# Altium footprint library AltiumLibraryDDT.PcbLib: 106 footprints (part 2 of 7)
Each footprint in its own frame and in the unit in brackets; x right, y up, seen from the top. Pads: shape width x height; smd on the part's side, far side on the other; paste and mask are expansions set on the pad; w line width, h text height; cw(c..) or ccw(c..) is an arc to the next point about the centre after c.
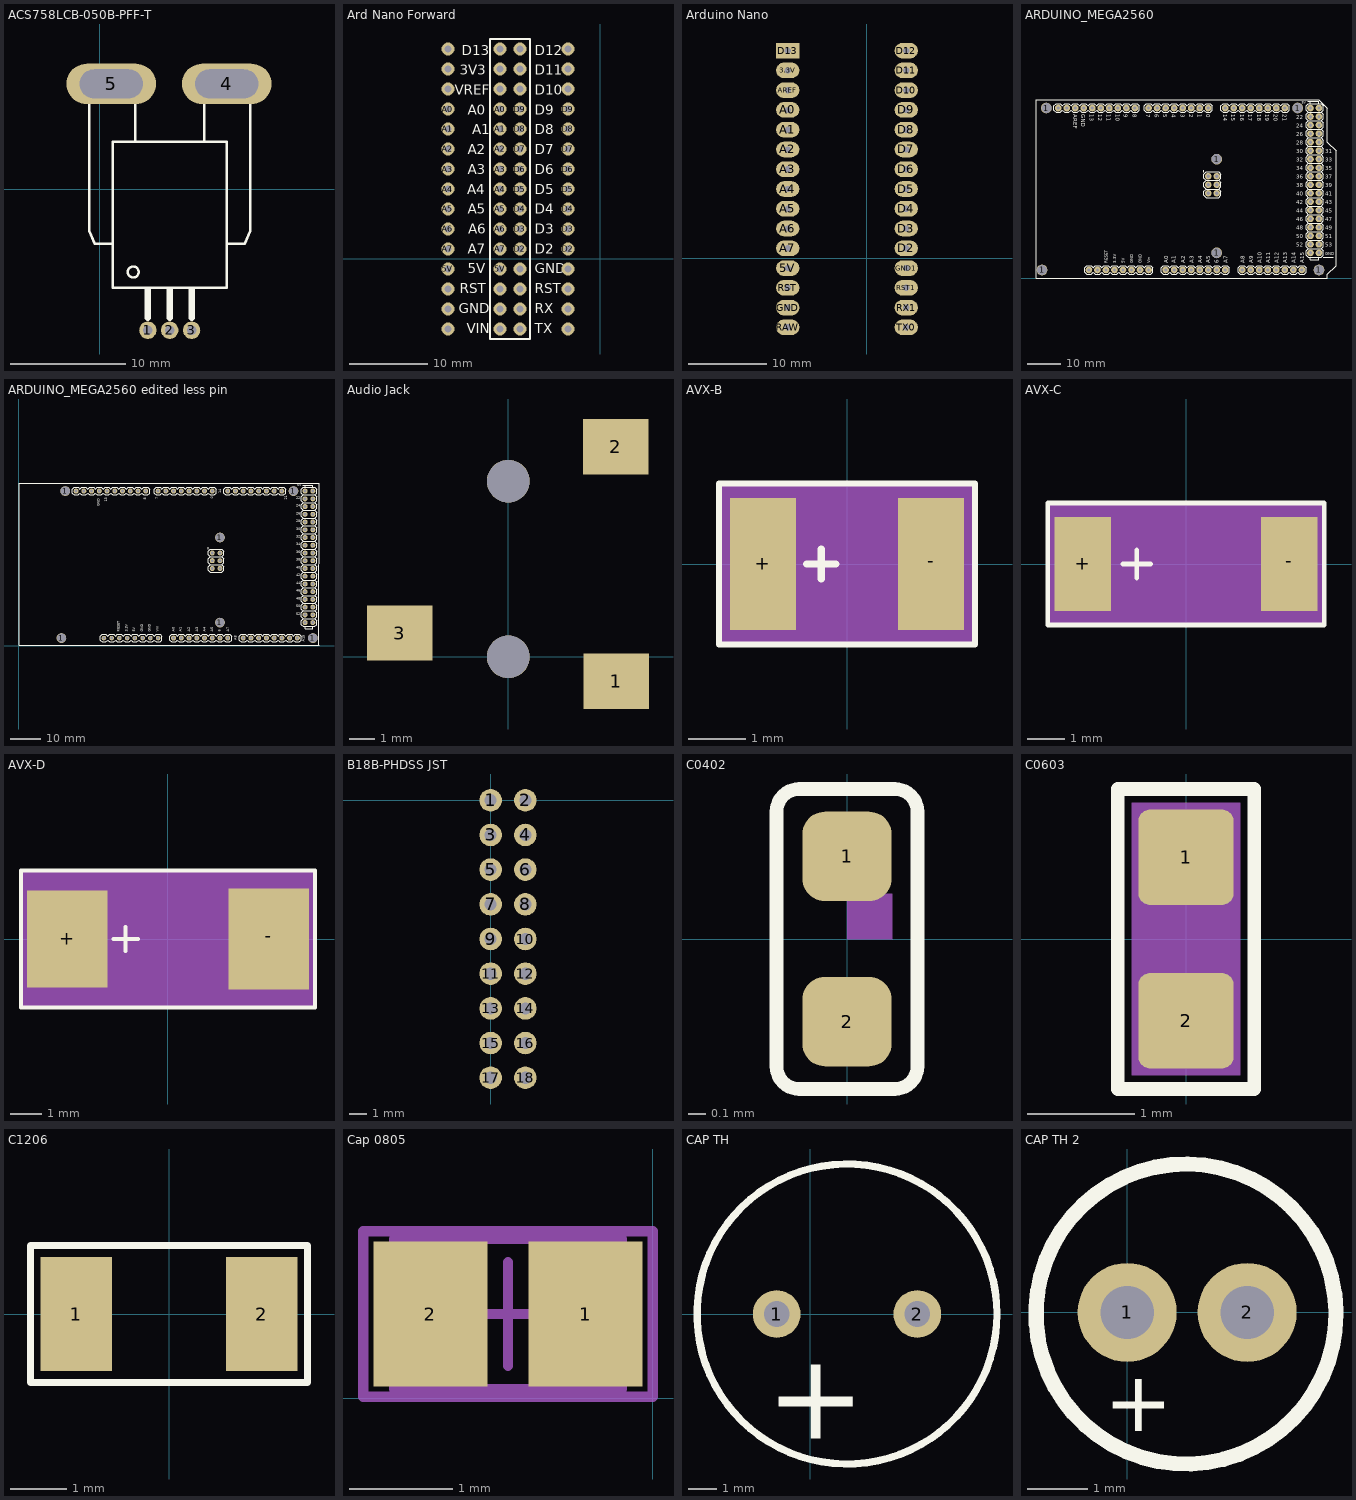
[diagram p1: the footprints below, top view; thin cyan lines are the x and y axes]

## ACS758LCB-050B-PFF-T [mil]
pads (5):
  oval 59.06x60 hole 31.5: 1(165,-483) 2(240,-483) 3(315,-483)
  oval 307.09x137.8 hole 98.43 slot 216.54 at 0 deg: 4(435,360) 5(40,360)
Top Overlay:
  circle w8: c115,-283.78 r18.8
  lines w8: -35.59,382.56 -35.59,162.09 -35.59,-143.03 -16.89,-187.32 42.17,-187.32 ; 121.89,162.09 121.89,382.56 ; 358.11,162.09 358.11,382.56 ; 436.85,-187.32 496.89,-187.32 515.59,-143.03 515.59,162.09 515.59,382.56 ; 45.12,-337.91 434.88,-337.91 434.88,162.09 45.12,162.09 45.12,-337.91
  lines w23.62: 164.8,-440.28 164.8,-346.77 ; 240,-440.28 240,-346.77 ; 315.2,-440.28 315.2,-346.77
3D body: height 275.59, standoff 0, extent 40,-347.5 440,167.5

## Ard Nano Forward [mil] "Arduino Nano, ATMEGA328"
pads (60):
  round 65 hole 35: 3.3V(-760,950) 3.3V(-500,950) 5V(-760,-50) 5V(-500,-50) A0(-760,750) A0(-500,750) A1(-760,650) A1(-500,650) A2(-760,550) A2(-500,550) A3(-760,450) A3(-500,450) A4(-760,350) A4(-500,350) A5(-760,250) A5(-500,250) A6(-760,150) A6(-500,150) A7(-760,50) A7(-500,50) AREF(-760,850) AREF(-500,850) D2(-400,50) D2(-160,50) D3(-400,150) D3(-160,150) D4(-400,250) D4(-160,250) D5(-400,350) D5(-160,350) D6(-400,450) D6(-160,450) D7(-400,550) D7(-160,550) D8(-400,650) D8(-160,650) D9(-400,750) D9(-160,750) D10(-400,850) D10(-160,850) D11(-400,950) D11(-160,950) D12(-400,1050) D12(-160,1050) D13(-760,1050) D13(-500,1050) GND(-760,-250) GND(-500,-250) GND1(-400,-50) GND1(-160,-50) RAW(-760,-350) RAW(-500,-350) RST(-760,-150) RST(-500,-150) RST1(-400,-150) RST1(-160,-150) RX1(-400,-250) RX1(-160,-250) TX0(-400,-350) TX0(-160,-350)
Top Overlay:
  lines w10: -550,-400 -350,-400 -350,1100 -550,1100 -550,-400
  text "A7" at -660.72,27.14 h50
  text "A6" at -658.34,126.43 h50
  text "A5" at -660.72,225.71 h50
  text "A4" at -663.1,325 h50
  text "A3" at -660.72,424.29 h50
  text "A2" at -660.72,523.57 h50
  text "A1" at -639.3,622.86 h50
  text "A0" at -660.72,722.14 h50
  text "VREF" at -726.9,821.43 h50
  text "3V3" at -700,920.71 h50
  text "D13" at -692.14,1020 h50
  text "5V" at -660.25,-72.14 h50
  text "RST" at -700,-171.43 h50
  text "GND" at -705.24,-270.71 h50
  text "VIN" at -665.96,-370 h50
  text "TX" at -326.9,-370 h50
  text "RX" at -326.9,-270.71 h50
  text "RST" at -326.9,-171.43 h50
  text "GND" at -326.9,-72.14 h50
  text "D12" at -326.9,1020 h50
  text "D11" at -326.9,920.71 h50
  text "D10" at -326.9,821.43 h50
  text "D9" at -326.9,722.14 h50
  text "D8" at -326.9,622.86 h50
  text "D7" at -326.9,523.57 h50
  text "D6" at -326.9,424.29 h50
  text "D5" at -326.9,325 h50
  text "D4" at -326.9,225.71 h50
  text "D3" at -326.9,126.43 h50
  text "D2" at -326.9,27.14 h50
Bottom Overlay:
  lines w10: -550,-400 -550,1100 -350,1100 -350,-400 -550,-400
  text "VIN" at -586.9,-370 h50
  text "GND" at -586.9,-270.71 h50
  text "RST" at -586.9,-171.43 h50
  text "5V" at -586.9,-72.14 h50
  text "D13" at -586.9,1020 h50
  text "3V3" at -586.9,920.71 h50
  text "VREF" at -586.9,821.43 h50
  text "A0" at -586.9,722.14 h50
  text "A1" at -586.9,622.86 h50
  text "A2" at -586.9,523.57 h50
  text "A3" at -586.9,424.29 h50
  text "A4" at -586.9,325 h50
  text "A5" at -586.9,225.71 h50
  text "A6" at -586.9,126.43 h50
  text "A7" at -586.9,27.14 h50
  text "D2" at -216.9,27.14 h50
  text "D3" at -216.9,126.43 h50
  text "D4" at -216.9,225.71 h50
  text "D5" at -216.9,325 h50
  text "D6" at -216.9,424.29 h50
  text "D7" at -216.9,523.57 h50
  text "D8" at -216.9,622.86 h50
  text "D9" at -216.9,722.14 h50
  text "D10" at -216.9,821.43 h50
  text "D11" at -216.9,920.71 h50
  text "D12" at -216.9,1020 h50
  text "GND" at -216.9,-72.14 h50
  text "RST" at -216.9,-171.43 h50
  text "RX" at -216.9,-270.71 h50
  text "TX" at -216.9,-370 h50
3D body "SAINSMART NANO V3.0 ATMEGA328.STEP": height 483.86, standoff -222.83, extent -811,-507.59 -111,1268

## Arduino Nano [mm] "Arduino Nano, ATMEGA328"
pads (30):
  oval 3x2 hole 0.8: 3.3V(-10.16,24.13) 5V(-10.16,-1.27) A0(-10.16,19.05) A1(-10.16,16.51) A2(-10.16,13.97) A3(-10.16,11.43) A4(-10.16,8.89) A5(-10.16,6.35) A6(-10.16,3.81) A7(-10.16,1.27) AREF(-10.16,21.59) D2(5.08,1.27) D3(5.08,3.81) D4(5.08,6.35) D5(5.08,8.89) D6(5.08,11.43) D7(5.08,13.97) D8(5.08,16.51) D9(5.08,19.05) D10(5.08,21.59) D11(5.08,24.13) D12(5.08,26.67) GND(-10.16,-6.35) GND1(5.08,-1.27) RAW(-10.16,-8.89) RST(-10.16,-3.81) RST1(5.08,-3.81) RX1(5.08,-6.35) TX0(5.08,-8.89)
  rect 3x2 hole 0.8: D13(-10.16,26.67)
3D body "arduino nano.stp": height 12.64, standoff 0.69, extent -11.286,-12.996 6.714,32.004

## ARDUINO_MEGA2560 [mm]
pads (98):
  round 2 hole 1: 0(63.5,50.8) 1(60.96,50.8) 2(58.42,50.8) 3(55.88,50.8) 3.3V(35.56,2.54) 4(53.34,50.8) 5(50.8,50.8) 5V(38.1,2.54) 5V.(93.98,50.8) 5V..(96.52,50.8) 6(48.26,50.8) 7(45.72,50.8) 8(41.656,50.8) 9(39.116,50.8) 10(36.576,50.8) 11(34.036,50.8) 12(31.496,50.8) 13(28.956,50.8) 14(68.58,50.8) 15(71.12,50.8) 16(73.66,50.8) 17(76.2,50.8) 18(78.74,50.8) 19(81.28,50.8) 20(83.82,50.8) 21(86.36,50.8) 22(93.98,48.26) 23(96.52,48.26) 24(93.98,45.72) 25(96.52,45.72) 26(93.98,43.18) 27(96.52,43.18) 28(93.98,40.64) 29(96.52,40.64) 30(93.98,38.1) 31(96.52,38.1) 32(93.98,35.56) 33(96.52,35.56) 34(93.98,33.02) 35(96.52,33.02) 36(93.98,30.48) 37(96.52,30.48) 38(93.98,27.94) 39(96.52,27.94) 40(93.98,25.4) 41(96.52,25.4) 42(93.98,22.86) 43(96.52,22.86) 44(93.98,20.32) 45(96.52,20.32) 46(93.98,17.78) 47(96.52,17.78) 48(93.98,15.24) 49(96.52,15.24) 50(93.98,12.7) 51(96.52,12.7) 52(93.98,10.16) 53(96.52,10.16) +5V_(66.04,30.48) A0(50.8,2.54) A1(53.34,2.54) A2(55.88,2.54) A3(58.42,2.54) A4(60.96,2.54) A5(63.5,2.54) A6(66.04,2.54) A7(68.58,2.54) A8(73.66,2.54) A9(76.2,2.54) A10(78.74,2.54) A11(81.28,2.54) A12(83.82,2.54) A13(86.36,2.54) A14(88.9,2.54) A15(91.44,2.54) AREF(23.876,50.8) GND(26.416,50.8) GND.(43.18,2.54) GND..(40.64,2.54) GND...(93.98,7.62) GND....(96.52,7.62) GND__(66.04,25.4) I/OREF(30.48,2.54) MISO(63.5,30.48) MOSI(66.04,27.94) N/C(27.94,2.54) RESET(33.02,2.54) RESET.(63.5,25.4) SCK(63.5,27.94) SCL1(18.796,50.8) SDA1(21.336,50.8) VIN(45.72,2.54)
  round 3.2 hole 3: 1(13.97,2.54) 1(15.24,50.8) 1(66.04,7.62) 1(66.04,35.56) 1(90.17,50.8) 1(96.52,2.54)
Top Overlay:
  drawing of 479 lines, arcs and shapes, not listed
  text "5V" at 91.44,52.07 h0.76
  text "AREF" at 23.241,49.022 h1.21
  text "GND" at 25.654,49.022 h1.21
  text "Vin" at 46.228,4.597 h0.86
  text "GND" at 43.688,4.597 h0.86
  text "GND" at 41.148,4.597 h0.86
  text "5V" at 38.608,4.597 h0.86
  text "3.3V" at 36.068,4.597 h0.86
  text "RESET" at 33.528,4.597 h0.86
  text "GND" at 98.425,6.883 h0.86
  text "A15" at 92.075,4.597 h1.21
  text "A14" at 89.662,4.597 h1.21
  text "A13" at 87.122,4.597 h1.21
  text "A12" at 84.582,4.597 h1.21
  text "A11" at 82.042,4.597 h1.21
  text "A10" at 79.502,4.597 h1.21
  text "A9" at 76.962,4.597 h1.21
  text "A8" at 74.422,4.597 h1.21
  text "A7" at 69.342,4.597 h1.21
  text "6" at 66.675,4.597 h1.21
  text "A5" at 64.135,4.597 h1.21
  text "A4" at 61.722,4.597 h1.21
  text "A3" at 59.182,4.597 h1.21
  text "A2" at 56.642,4.597 h1.21
  text "A1" at 53.848,4.597 h1.21
  text "A0" at 51.562,4.597 h1.21
  text "53" at 98.425,9.423 h1.21
  text "51" at 98.425,11.963 h1.21
  text "49" at 98.425,14.503 h1.21
  text "47" at 98.425,17.043 h1.21
  text "45" at 98.425,19.583 h1.21
  text "43" at 98.425,22.123 h1.21
  text "41" at 98.425,24.663 h1.21
  text "39" at 98.425,27.203 h1.21
  text "37" at 98.425,29.743 h1.21
  text "35" at 98.425,32.283 h1.21
  text "33" at 98.425,34.823 h1.21
  text "31" at 98.425,37.363 h1.21
  text "52" at 89.687,9.398 h1.21
  text "48" at 89.687,14.478 h1.21
  text "50" at 89.687,11.938 h1.21
  text "46" at 89.687,17.018 h1.21
  text "44" at 89.687,19.558 h1.21
  text "42" at 89.687,22.098 h1.21
  text "40" at 89.687,24.638 h1.21
  text "38" at 89.687,27.178 h1.21
  text "36" at 89.687,29.718 h1.21
  text "34" at 89.687,32.258 h1.21
  text "32" at 89.687,34.798 h1.21
  text "30" at 89.687,37.338 h1.21
  text "28" at 89.687,39.878 h1.21
  text "26" at 89.687,42.418 h1.21
  text "24" at 89.687,44.958 h1.21
  text "22" at 89.687,47.498 h1.21
  text "21" at 85.725,48.895 h1.21
  text "20" at 83.058,48.895 h1.21
  text "19" at 80.518,49.022 h1.21
  text "18" at 78.105,49.022 h1.21
  text "17" at 75.438,49.022 h1.21
  text "16" at 73.025,49.022 h1.21
  text "15" at 70.358,49.022 h1.21
  text "14" at 67.945,49.022 h1.21
  text "13" at 28.194,49.022 h1.21
  text "12" at 30.734,49.022 h1.21
  text "11" at 33.274,49.022 h1.21
  text "10" at 35.941,49.022 h1.21
  text "9" at 38.354,49.022 h1.21
  text "8" at 41.021,49.022 h1.21
  text "7" at 45.085,49.022 h1.21
  text "6" at 47.625,49.022 h1.21
  text "5" at 50.165,49.022 h1.21
  text "4" at 52.705,49.022 h1.21
  text "3" at 55.245,49.022 h1.21
  text "2" at 57.785,49.022 h1.21
  text "1" at 60.325,49.022 h1.21
  text "0" at 62.865,49.022 h1.21
Mechanical 16:
  region: 66.294,30.226 66.294,30.734 65.786,30.734 65.786,30.226
  region: 63.754,30.226 63.754,30.734 63.246,30.734 63.246,30.226
  region: 66.294,27.686 66.294,28.194 65.786,28.194 65.786,27.686
  region: 63.754,27.686 63.754,28.194 63.246,28.194 63.246,27.686
  region: 63.754,25.146 63.754,25.654 63.246,25.654 63.246,25.146
  region: 66.294,25.146 66.294,25.654 65.786,25.654 65.786,25.146
  rectangle: 27.686,2.286 28.194,2.794
  rectangle: 30.226,2.286 30.734,2.794
  rectangle: 18.542,50.546 19.05,51.054
  rectangle: 21.082,50.546 21.59,51.054
  rectangle: 32.766,2.286 33.274,2.794
  rectangle: 35.306,2.286 35.814,2.794
  rectangle: 37.846,2.286 38.354,2.794
  rectangle: 40.386,2.286 40.894,2.794
  rectangle: 42.926,2.286 43.434,2.794
  rectangle: 45.466,2.286 45.974,2.794
  rectangle: 93.726,50.546 94.234,51.054
  rectangle: 96.266,50.546 96.774,51.054
  rectangle: 93.726,7.366 94.234,7.874
  rectangle: 96.266,7.366 96.774,7.874
  region: 96.774,27.686 96.774,28.194 96.266,28.194 96.266,27.686
  region: 94.234,27.686 94.234,28.194 93.726,28.194 93.726,27.686
  region: 96.774,25.146 96.774,25.654 96.266,25.654 96.266,25.146
  region: 94.234,25.146 94.234,25.654 93.726,25.654 93.726,25.146
  region: 96.774,22.606 96.774,23.114 96.266,23.114 96.266,22.606
  region: 96.774,20.066 96.774,20.574 96.266,20.574 96.266,20.066
  region: 96.774,17.526 96.774,18.034 96.266,18.034 96.266,17.526
  region: 94.234,22.606 94.234,23.114 93.726,23.114 93.726,22.606
  region: 94.234,20.066 94.234,20.574 93.726,20.574 93.726,20.066
  region: 94.234,17.526 94.234,18.034 93.726,18.034 93.726,17.526
  region: 96.774,14.986 96.774,15.494 96.266,15.494 96.266,14.986
  region: 94.234,14.986 94.234,15.494 93.726,15.494 93.726,14.986
  region: 96.774,12.446 96.774,12.954 96.266,12.954 96.266,12.446
  region: 94.234,12.446 94.234,12.954 93.726,12.954 93.726,12.446
  region: 94.234,9.906 94.234,10.414 93.726,10.414 93.726,9.906
  region: 96.774,9.906 96.774,10.414 96.266,10.414 96.266,9.906
  region: 96.774,48.006 96.774,48.514 96.266,48.514 96.266,48.006
  region: 94.234,48.006 94.234,48.514 93.726,48.514 93.726,48.006
  region: 96.774,45.466 96.774,45.974 96.266,45.974 96.266,45.466
  region: 94.234,45.466 94.234,45.974 93.726,45.974 93.726,45.466
  region: 96.774,42.926 96.774,43.434 96.266,43.434 96.266,42.926
  region: 96.774,40.386 96.774,40.894 96.266,40.894 96.266,40.386
  region: 96.774,37.846 96.774,38.354 96.266,38.354 96.266,37.846
  region: 94.234,42.926 94.234,43.434 93.726,43.434 93.726,42.926
  region: 94.234,40.386 94.234,40.894 93.726,40.894 93.726,40.386
  region: 94.234,37.846 94.234,38.354 93.726,38.354 93.726,37.846
  region: 96.774,35.306 96.774,35.814 96.266,35.814 96.266,35.306
  region: 94.234,35.306 94.234,35.814 93.726,35.814 93.726,35.306
  region: 96.774,32.766 96.774,33.274 96.266,33.274 96.266,32.766
  region: 94.234,32.766 94.234,33.274 93.726,33.274 93.726,32.766
  region: 94.234,30.226 94.234,30.734 93.726,30.734 93.726,30.226
  region: 96.774,30.226 96.774,30.734 96.266,30.734 96.266,30.226
  rectangle: 41.402,50.546 41.91,51.054
  rectangle: 23.622,50.546 24.13,51.054
  rectangle: 26.162,50.546 26.67,51.054
  rectangle: 28.702,50.546 29.21,51.054
  rectangle: 31.242,50.546 31.75,51.054
  rectangle: 33.782,50.546 34.29,51.054
  rectangle: 36.322,50.546 36.83,51.054
  rectangle: 38.862,50.546 39.37,51.054
  rectangle: 63.246,50.546 63.754,51.054
  rectangle: 45.466,50.546 45.974,51.054
  rectangle: 48.006,50.546 48.514,51.054
  rectangle: 50.546,50.546 51.054,51.054
  rectangle: 53.086,50.546 53.594,51.054
  rectangle: 55.626,50.546 56.134,51.054
  rectangle: 58.166,50.546 58.674,51.054
  rectangle: 60.706,50.546 61.214,51.054
  rectangle: 68.326,2.286 68.834,2.794
  rectangle: 50.546,2.286 51.054,2.794
  rectangle: 53.086,2.286 53.594,2.794
  rectangle: 55.626,2.286 56.134,2.794
  rectangle: 58.166,2.286 58.674,2.794
  rectangle: 60.706,2.286 61.214,2.794
  rectangle: 63.246,2.286 63.754,2.794
  rectangle: 65.786,2.286 66.294,2.794
  rectangle: 86.106,50.546 86.614,51.054
  rectangle: 68.326,50.546 68.834,51.054
  rectangle: 70.866,50.546 71.374,51.054
  rectangle: 73.406,50.546 73.914,51.054
  rectangle: 75.946,50.546 76.454,51.054
  rectangle: 78.486,50.546 78.994,51.054
  rectangle: 81.026,50.546 81.534,51.054
  rectangle: 83.566,50.546 84.074,51.054
  rectangle: 91.186,2.286 91.694,2.794
  rectangle: 73.406,2.286 73.914,2.794
  rectangle: 75.946,2.286 76.454,2.794
  rectangle: 78.486,2.286 78.994,2.794
  rectangle: 81.026,2.286 81.534,2.794
  rectangle: 83.566,2.286 84.074,2.794
  rectangle: 86.106,2.286 86.614,2.794
  rectangle: 88.646,2.286 89.154,2.794
3D body "arduino MEGA2650.STEP": height -0.38, standoff -15.63, extent -6.502,0.051 101.448,53.391
3D body "Pin Header 1x8 TH Pitch 2.54mm.stp": height 2.44, standoff -10.26, extent 26.67,1.27 46.99,3.81
3D body "Pin Header 1x10 TH Pitch 2.54mm.stp": height 2.44, standoff -10.26, extent 92.71,26.67 95.25,52.07
3D body "Pin Header 1x10 TH Pitch 2.54mm.stp": height 2.44, standoff -10.26, extent 95.25,26.67 97.79,52.07
3D body "Pin Header 1x10 TH Pitch 2.54mm.stp": height 2.44, standoff -10.26, extent 17.526,49.53 42.926,52.07

## ARDUINO_MEGA2560 edited less pin [mil]
pads (98):
  round 65 hole 35: 0(2500,2000) 1(2400,2000) 2(2300,2000) 3(2200,2000) 4(2100,2000) 5(2000,2000) 5V.(3700,2000) 5V..(3800,2000) 6(1900,2000) 7(1800,2000) 8(1640,2000) 9(1540,2000) 10(1440,2000) 11(1340,2000) 12(1240,2000) 13(1140,2000) 14(2700,2000) 15(2800,2000) 16(2900,2000) 17(3000,2000) 18(3100,2000) 19(3200,2000) 20(3300,2000) 21(3400,2000) 22(3700,1900) 23(3800,1900) 24(3700,1800) 25(3800,1800) 26(3700,1700) 27(3800,1700) 28(3700,1600) 29(3800,1600) 30(3700,1500) 31(3800,1500) 32(3700,1400) 33(3800,1400) 34(3700,1300) 35(3800,1300) 36(3700,1200) 37(3800,1200) 38(3700,1100) 39(3800,1100) 40(3700,1000) 41(3800,1000) 42(3700,900) 43(3800,900) 44(3700,800) 45(3800,800) 46(3700,700) 47(3800,700) 48(3700,600) 49(3800,600) 50(3700,500) 51(3800,500) 52(3700,400) 53(3800,400) +5V_(2600,1200) A0(2000,100) A1(2100,100) A2(2200,100) A3(2300,100) A4(2400,100) A5(2500,100) A6(2600,100) A7(2700,100) A8(2900,100) A9(3000,100) A10(3100,100) A11(3200,100) A12(3300,100) A13(3400,100) A14(3500,100) A15(3600,100) AREF(940,2000) GND(1040,2000) GND...(3700,300) GND....(3800,300) GND__(2600,1000) MISO(2500,1200) MOSI(2600,1100) RESET.(2500,1000) SCK(2500,1100) SCL1(740,2000) SDA1(840,2000)
  round 125.98 hole 118.11: 1(550,100) 1(600,2000) 1(2600,300) 1(2600,1400) 1(3550,2000) 1(3800,100)
  round 60 hole 35: 3.3V(1400,100) 5V(1500,100) GND.(1700,100) GND..(1600,100) I/OREF(1200,100) N/C(1100,100) RESET(1300,100) VIN(1800,100)
Top Overlay:
  drawing of 473 lines, arcs and shapes, not listed
  text "RESET" at 1320,181 h59.06
  text "3.3V" at 1420,181 h59.06
  text "5V" at 1520,181 h59.06
  text "GND" at 1620,181 h59.06
  text "GND" at 1720,181 h59.06
  text "Vin" at 1820,181 h59.06
  text "0" at 2524,1898 h59.06
  text "7" at 1816,1895 h59.06
  text "8" at 1660,1890 h59.06
  text "13" at 1154,1865 h59.06
  text "14" at 2630,1969 h59.06
  text "21" at 3482,1889 h59.06
  text "22" at 3583,1884 h59.06
  text "24" at 3583,1784 h59.06
  text "26" at 3583,1684 h59.06
  text "28" at 3583,1584 h59.06
  text "30" at 3583,1484 h59.06
  text "32" at 3583,1384 h59.06
  text "34" at 3583,1284 h59.06
  text "36" at 3583,1184 h59.06
  text "38" at 3583,1084 h59.06
  text "40" at 3583,984 h59.06
  text "42" at 3583,884 h59.06
  text "44" at 3583,784 h59.06
  text "46" at 3583,684 h59.06
  text "50" at 3583,484 h59.06
  text "48" at 3583,584 h59.06
  text "52" at 3583,384 h59.06
  text "A0" at 2030,181 h59.06
  text "A1" at 2120,181 h59.06
  text "A2" at 2230,181 h59.06
  text "A3" at 2330,181 h59.06
  text "A4" at 2430,181 h59.06
  text "A5" at 2525,181 h59.06
  text "6" at 2625,181 h59.06
  text "A7" at 2730,181 h59.06
  text "A8" at 2828,69 h59.06
  text "A15" at 3710,55 h59.06
  text "GND" at 1056,1802 h59.06
  text "5V" at 3600,2050 h59.06
Mechanical 16:
  rectangle: 1790,90 1810,110
  rectangle: 1690,90 1710,110
  rectangle: 1590,90 1610,110
  rectangle: 1490,90 1510,110
  rectangle: 1390,90 1410,110
  rectangle: 1290,90 1310,110
  rectangle: 1190,90 1210,110
  rectangle: 1090,90 1110,110
  rectangle: 3490,90 3510,110
  rectangle: 3390,90 3410,110
  rectangle: 3290,90 3310,110
  rectangle: 3190,90 3210,110
  rectangle: 3090,90 3110,110
  rectangle: 2990,90 3010,110
  rectangle: 2890,90 2910,110
  rectangle: 3290,1990 3310,2010
  rectangle: 3190,1990 3210,2010
  rectangle: 3090,1990 3110,2010
  rectangle: 2990,1990 3010,2010
  rectangle: 2890,1990 2910,2010
  rectangle: 2790,1990 2810,2010
  rectangle: 2690,1990 2710,2010
  rectangle: 3390,1990 3410,2010
  rectangle: 2590,90 2610,110
  rectangle: 2490,90 2510,110
  rectangle: 2390,90 2410,110
  rectangle: 2290,90 2310,110
  rectangle: 2190,90 2210,110
  rectangle: 2090,90 2110,110
  rectangle: 1990,90 2010,110
  rectangle: 2690,90 2710,110
  rectangle: 2390,1990 2410,2010
  rectangle: 2290,1990 2310,2010
  rectangle: 2190,1990 2210,2010
  rectangle: 2090,1990 2110,2010
  rectangle: 1990,1990 2010,2010
  rectangle: 1890,1990 1910,2010
  rectangle: 1790,1990 1810,2010
  rectangle: 2490,1990 2510,2010
  rectangle: 1530,1990 1550,2010
  rectangle: 1430,1990 1450,2010
  rectangle: 1330,1990 1350,2010
  rectangle: 1230,1990 1250,2010
  rectangle: 1130,1990 1150,2010
  rectangle: 1030,1990 1050,2010
  rectangle: 930,1990 950,2010
  rectangle: 1630,1990 1650,2010
  region: 3810,1190 3810,1210 3790,1210 3790,1190
  region: 3710,1190 3710,1210 3690,1210 3690,1190
  region: 3710,1290 3710,1310 3690,1310 3690,1290
  region: 3810,1290 3810,1310 3790,1310 3790,1290
  region: 3710,1390 3710,1410 3690,1410 3690,1390
  region: 3810,1390 3810,1410 3790,1410 3790,1390
  region: 3710,1490 3710,1510 3690,1510 3690,1490
  region: 3710,1590 3710,1610 3690,1610 3690,1590
  region: 3710,1690 3710,1710 3690,1710 3690,1690
  region: 3810,1490 3810,1510 3790,1510 3790,1490
  region: 3810,1590 3810,1610 3790,1610 3790,1590
  region: 3810,1690 3810,1710 3790,1710 3790,1690
  region: 3710,1790 3710,1810 3690,1810 3690,1790
  region: 3810,1790 3810,1810 3790,1810 3790,1790
  region: 3710,1890 3710,1910 3690,1910 3690,1890
  region: 3810,1890 3810,1910 3790,1910 3790,1890
  region: 3810,390 3810,410 3790,410 3790,390
  region: 3710,390 3710,410 3690,410 3690,390
  region: 3710,490 3710,510 3690,510 3690,490
  region: 3810,490 3810,510 3790,510 3790,490
  region: 3710,590 3710,610 3690,610 3690,590
  region: 3810,590 3810,610 3790,610 3790,590
  region: 3710,690 3710,710 3690,710 3690,690
  region: 3710,790 3710,810 3690,810 3690,790
  region: 3710,890 3710,910 3690,910 3690,890
  region: 3810,690 3810,710 3790,710 3790,690
  region: 3810,790 3810,810 3790,810 3790,790
  region: 3810,890 3810,910 3790,910 3790,890
  region: 3710,990 3710,1010 3690,1010 3690,990
  region: 3810,990 3810,1010 3790,1010 3790,990
  region: 3710,1090 3710,1110 3690,1110 3690,1090
  region: 3810,1090 3810,1110 3790,1110 3790,1090
  rectangle: 3790,290 3810,310
  rectangle: 3690,290 3710,310
  rectangle: 3790,1990 3810,2010
  rectangle: 3690,1990 3710,2010
  rectangle: 830,1990 850,2010
  rectangle: 730,1990 750,2010
  region: 2610,990 2610,1010 2590,1010 2590,990
  region: 2510,990 2510,1010 2490,1010 2490,990
  region: 2510,1090 2510,1110 2490,1110 2490,1090
  region: 2610,1090 2610,1110 2590,1110 2590,1090
  region: 2510,1190 2510,1210 2490,1210 2490,1190
  region: 2610,1190 2610,1210 2590,1210 2590,1190
3D body "Pin Header 1x8 TH Pitch 2.54mm.stp": height 95.98, standoff -403.85, extent 1050,50 1850,150
3D body "Pin Header 1x10 TH Pitch 2.54mm.stp": height 95.98, standoff -403.85, extent 690.01,1950 1690,2050
3D body "Pin Header 1x10 TH Pitch 2.54mm.stp": height 95.98, standoff -403.85, extent 3750,1050 3850,2050
3D body "Pin Header 1x10 TH Pitch 2.54mm.stp": height 95.98, standoff -403.85, extent 3650,1050 3750,2050
3D body "arduino MEGA2650.STEP": height -68.9, standoff -669.29, extent -256,2 3994,2102

## Audio Jack [mm]
pads (5):
  rect 2.6x2.2 all layers, no hole: 1(4.3,-0.975) 2(4.275,8.375) 3(-4.325,0.95)
  round 1.7 hole 1.7: ""(0,0) ""(0,7)
3D body "CUI_SJ-3523-SMT-TR.step": height 5, standoff -0.8, extent -4.525,-5.975 4.475,11.025

## AVX-B [mil]
pads (2):
  rect 45x90 smd: +(-57.5,0) -(57.5,0)
Top Overlay:
  lines w4: -87.5,-55 -87.5,55 87.5,55 87.5,-55 -87.5,-55
  lines w5: -27.5,0 -7.5,0 ; -17.5,-10 -17.5,10
Mechanical 16:
  rectangle: -87.5,-55 87.5,55
3D body "User Library-Tantalum Capacitor Case B_Tantalum case B part1.SLDPRT": height 82.68, standoff 3.94, extent -71.8,-55.51 66,55.51

## AVX-C [mil]
pads (2):
  rect 60x100 smd: +(-110,0) -(110,0)
Top Overlay:
  lines w5: -67.5,0 -37.5,0 ; -52.5,-15 -52.5,15 ; -147.5,-65 -147.5,65 147.5,65 147.5,-65 -147.5,-65
Mechanical 16:
  rectangle: -147.5,-65 147.5,65
3D body "User Library-AVX_C_CASE.SLDPRT": height 106.3, standoff 0, extent -119.07,-64.94 121.09,66.95

## AVX-D [mil]
pads (2):
  rect 100x120 smd: +(-125,0)
  rect 100x125 smd: -(125,0)
Top Overlay:
  lines w5: -67.5,0 -37.5,0 ; -52.5,-15 -52.5,15 ; -182.5,-85 -182.5,85 182.5,85 182.5,-85 -182.5,-85
Mechanical 16:
  rectangle: -182.5,-85 182.5,85
3D body "User Library-AVX_D_CASE.SLDPRT": height 118.62, standoff 0, extent -147.66,-88.59 143.69,86.61

## B18B-PHDSS JST [mm]
pads (18):
  round 1.3 hole 0.7: 1(0,0) 2(2,0) 3(0,-2) 4(2,-2) 5(0,-4) 6(2,-4) 7(0,-6) 8(2,-6) 9(0,-8) 10(2,-8) 11(0,-10) 12(2,-10) 13(0,-12) 14(2,-12) 15(0,-14) 16(2,-14) 17(0,-16) 18(2,-16)
3D body "B18B-PHDSS.STEP": height 6.5, standoff -3, extent -1.499,-17.976 3.501,1.924

## C0402 [mil]
pads (2):
  rrect50% 19.69x19.69 smd: 1(0,18.21) 2(0,-18.21)
Top Overlay:
  lines w3: -15.53,-28.03 ccw(c-10.53,-28.03) -10.53,-33.03 10.53,-33.03 ccw(c10.53,-28.03) 15.53,-28.03 15.53,28.03 ccw(c10.53,28.03) 10.53,33.03 -10.53,33.03 ccw(c-10.53,28.03) -15.53,28.03 -15.53,-28.03
Mechanical 16:
  region: 0,0 10,0 10,10 0,10

## C0603 [mil]
pads (2):
  rrect25% 35x35 smd: 1(0,30) 2(0,-30)
Top Overlay:
  lines w5: -25,-55 -25,55 25,55 25,-55 -25,-55
Mechanical 16:
  region: -20,50 -20,-50 20,-50 20,50
3D body: height 51.18, standoff 0, extent -18.4,-36.45 19,32.45

## C1206 [mil]
pads (2):
  rect 50x80 smd: 1(-65,0) 2(65,0)
Top Overlay:
  lines w5: -97,-48 97,-48 97,48 -97,48 -97,-48
3D body: height 78.74, standoff 3.94, extent -81,-45 82,47

## Cap 0805 [mm]
pads (2):
  rect 1.1x1.4 smd: 1(-0.647,0.813) 2(-2.147,0.813)
Mechanical 13:
  lines w0.1: -2.497,0.088 -0.297,0.088 -0.297,1.538 -2.497,1.538 -2.497,0.088
Mechanical 15:
  lines w0.1: -1.897,0.813 -0.897,0.813 ; -1.397,0.313 -1.397,1.313 ; -2.797,0.013 0.003,0.013 0.003,1.613 -2.797,1.613 -2.797,0.013
3D body "CAP0805.stp": height -0.43, standoff -1.21, extent -2.397,0.188 -0.397,1.438

## CAP TH [mil]
pads (2):
  round 65 hole 35: 1(-46,0) 2(146,0)
Top Overlay:
  circle w10: c50,0 r204.72
  text "+" at -60,-170 h118.11
3D body: height 525.2, standoff 15.75, extent -150.78,-199.78 250.79,201.8

## CAP TH 2 [mil]
pads (2):
  round 65 hole 35: 1(0,0) 2(78.74,0)
Top Overlay:
  lines w10: 137.02,1.17 ccw(c38.61,-1.03) 137.04,-1.03
  text "+" at -15,-78 h39.37
3D body "CAP-ALU-H11.2D5.0P2.0LD0.5 LD long.stp": height 520.47, standoff -708.27, extent -59.04,-99.07 137.04,97